# Altium footprint library Chip_Packaging.PcbLib: 101 footprints (part 5 of 7)
Each footprint in its own frame and in the unit in brackets; x right, y up, seen from the top. Pads: shape width x height; smd on the part's side, far side on the other; paste and mask are expansions set on the pad; w line width, h text height; cw(c..) or ccw(c..) is an arc to the next point about the centre after c.
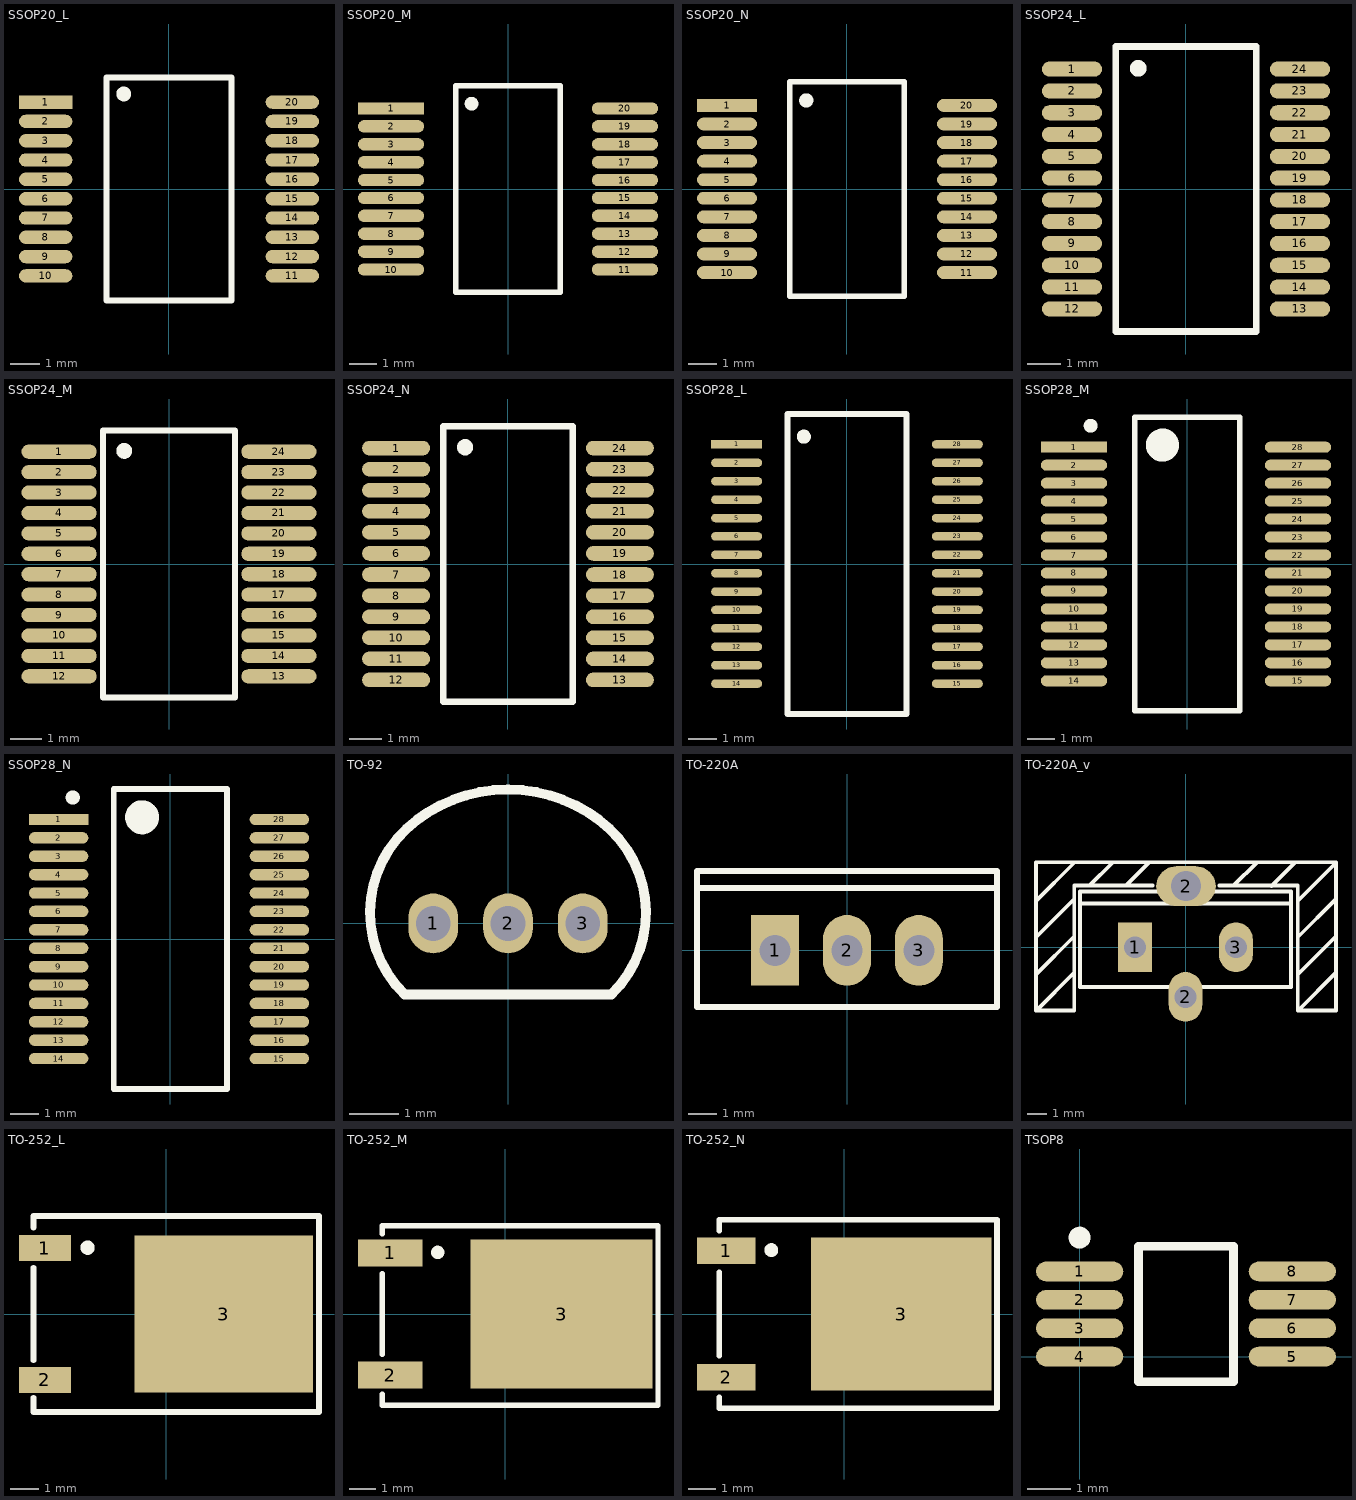
[diagram p4: the footprints below, top view; thin cyan lines are the x and y axes]

## SSOP20_L [mm] "SOP, 20-Leads, Body 7.2x5.3mm, Pitch 0.65mm, IPC High Density"
height 1.99
pads (20):
  rect 1.8x0.45 smd: 1(-4.15,2.925)
  oval 1.8x0.45 smd: 2(-4.15,2.275) 3(-4.15,1.625) 4(-4.15,0.975) 5(-4.15,0.325) 6(-4.15,-0.325) 7(-4.15,-0.975) 8(-4.15,-1.625) 9(-4.15,-2.275) 10(-4.15,-2.925) 11(4.15,-2.925) 12(4.15,-2.275) 13(4.15,-1.625) 14(4.15,-0.975) 15(4.15,-0.325) 16(4.15,0.325) 17(4.15,0.975) 18(4.15,1.625) 19(4.15,2.275) 20(4.15,2.925)
Top Overlay:
  circle w0.25: c-1.525,3.2 r0.125
  lines w0.2: -2.1,-3.75 -2.1,3.75 2.1,3.75 2.1,-3.75 -2.1,-3.75
3D body "SSOP20.STEP": height 1.79, standoff -0.05, extent -3.95,-3.65 3.95,3.65

## SSOP20_M [mm] "SOP, 20-Leads, Body 7.2x5.3mm, Pitch 0.65mm, IPC Low Density"
height 1.99
pads (20):
  rect 2.4x0.45 smd: 1(-4.25,2.925)
  oval 2.4x0.45 smd: 2(-4.25,2.275) 3(-4.25,1.625) 4(-4.25,0.975) 5(-4.25,0.325) 6(-4.25,-0.325) 7(-4.25,-0.975) 8(-4.25,-1.625) 9(-4.25,-2.275) 10(-4.25,-2.925) 11(4.25,-2.925) 12(4.25,-2.275) 13(4.25,-1.625) 14(4.25,-0.975) 15(4.25,-0.325) 16(4.25,0.325) 17(4.25,0.975) 18(4.25,1.625) 19(4.25,2.275) 20(4.25,2.925)
Top Overlay:
  circle w0.25: c-1.325,3.1 r0.125
  lines w0.2: -1.9,-3.75 1.9,-3.75 1.9,3.75 -1.9,3.75 -1.9,-3.75
3D body "SSOP20.STEP": height 1.79, standoff -0.05, extent -3.95,-3.65 3.95,3.65

## SSOP20_N [mm] "SOP, 20-Leads, Body 7.2x5.3mm, Pitch 0.65mm, IPC Medium Density"
height 1.99
pads (20):
  rect 2.1x0.45 smd: 1(-4.2,2.925)
  oval 2.1x0.45 smd: 2(-4.2,2.275) 3(-4.2,1.625) 4(-4.2,0.975) 5(-4.2,0.325) 6(-4.2,-0.325) 7(-4.2,-0.975) 8(-4.2,-1.625) 9(-4.2,-2.275) 10(-4.2,-2.925) 11(4.2,-2.925) 12(4.2,-2.275) 13(4.2,-1.625) 14(4.2,-0.975) 15(4.2,-0.325) 16(4.2,0.325) 17(4.2,0.975) 18(4.2,1.625) 19(4.2,2.275) 20(4.2,2.925)
Top Overlay:
  circle w0.25: c-1.425,3.1 r0.125
  lines w0.2: -2,-3.75 2,-3.75 2,3.75 -2,3.75 -2,-3.75
3D body "SSOP20.STEP": height 1.79, standoff -0.05, extent -3.95,-3.65 3.95,3.65

## SSOP24_L [mm] "SOP, 24-Leads, Body 8.2x5.3mm, Pitch 0.65mm, IPC High Density"
height 1.99
pads (24):
  oval 1.8x0.45 smd: 1(-3.4,3.575) 2(-3.4,2.925) 3(-3.4,2.275) 4(-3.4,1.625) 5(-3.4,0.975) 6(-3.4,0.325) 7(-3.4,-0.325) 8(-3.4,-0.975) 9(-3.4,-1.625) 10(-3.4,-2.275) 11(-3.4,-2.925) 12(-3.4,-3.575) 13(3.4,-3.575) 14(3.4,-2.925) 15(3.4,-2.275) 16(3.4,-1.625) 17(3.4,-0.975) 18(3.4,-0.325) 19(3.4,0.325) 20(3.4,0.975) 21(3.4,1.625) 22(3.4,2.275) 23(3.4,2.925) 24(3.4,3.575)
Top Overlay:
  circle w0.25: c-1.425,3.6 r0.125
  lines w0.2: -2.1,-4.25 2.1,-4.25 2.1,4.25 -2.1,4.25 -2.1,-4.25

## SSOP24_M [mm] "SOP, 24-Leads, Body 8.2x5.3mm, Pitch 0.65mm, IPC Low Density"
height 1.99
pads (24):
  oval 2.4x0.45 smd: 1(-3.5,3.575) 2(-3.5,2.925) 3(-3.5,2.275) 4(-3.5,1.625) 5(-3.5,0.975) 6(-3.5,0.325) 7(-3.5,-0.325) 8(-3.5,-0.975) 9(-3.5,-1.625) 10(-3.5,-2.275) 11(-3.5,-2.925) 12(-3.5,-3.575) 13(3.5,-3.575) 14(3.5,-2.925) 15(3.5,-2.275) 16(3.5,-1.625) 17(3.5,-0.975) 18(3.5,-0.325) 19(3.5,0.325) 20(3.5,0.975) 21(3.5,1.625) 22(3.5,2.275) 23(3.5,2.925) 24(3.5,3.575)
Top Overlay:
  circle w0.25: c-1.425,3.6 r0.125
  lines w0.2: -2.1,-4.25 -2.1,4.25 2.1,4.25 2.1,-4.25 -2.1,-4.25

## SSOP24_N [mm] "SOP, 24-Leads, Body 8.2x5.3mm, Pitch 0.65mm, IPC Medium Density"
height 1.99
pads (24):
  oval 2.1x0.45 smd: 1(-3.45,3.575) 2(-3.45,2.925) 3(-3.45,2.275) 4(-3.45,1.625) 5(-3.45,0.975) 6(-3.45,0.325) 7(-3.45,-0.325) 8(-3.45,-0.975) 9(-3.45,-1.625) 10(-3.45,-2.275) 11(-3.45,-2.925) 12(-3.45,-3.575) 13(3.45,-3.575) 14(3.45,-2.925) 15(3.45,-2.275) 16(3.45,-1.625) 17(3.45,-0.975) 18(3.45,-0.325) 19(3.45,0.325) 20(3.45,0.975) 21(3.45,1.625) 22(3.45,2.275) 23(3.45,2.925) 24(3.45,3.575)
Top Overlay:
  circle w0.25: c-1.325,3.6 r0.125
  lines w0.2: -2,-4.25 2,-4.25 2,4.25 -2,4.25 -2,-4.25

## SSOP28_L [mm] "SOP, 28-Leads, Body 10.2x5.3mm, Pitch 0.65mm, IPC High Density"
height 1.99
pads (28):
  rect 1.8x0.3 smd: 1(-3.9,4.225)
  oval 1.8x0.3 smd: 2(-3.9,3.575) 3(-3.9,2.925) 4(-3.9,2.275) 5(-3.9,1.625) 6(-3.9,0.975) 7(-3.9,0.325) 8(-3.9,-0.325) 9(-3.9,-0.975) 10(-3.9,-1.625) 11(-3.9,-2.275) 12(-3.9,-2.925) 13(-3.9,-3.575) 14(-3.9,-4.225) 15(3.9,-4.225) 16(3.9,-3.575) 17(3.9,-2.925) 18(3.9,-2.275) 19(3.9,-1.625) 20(3.9,-0.975) 21(3.9,-0.325) 22(3.9,0.325) 23(3.9,0.975) 24(3.9,1.625) 25(3.9,2.275) 26(3.9,2.925) 27(3.9,3.575) 28(3.9,4.225)
Top Overlay:
  circle w0.25: c-1.525,4.5 r0.125
  lines w0.2: -2.1,-5.3 2.1,-5.3 2.1,5.3 -2.1,5.3 -2.1,-5.3
3D body "SSOP28.STEP": height 1.98, standoff -0.02, extent -3.906,-5.1 3.906,5.1

## SSOP28_M [mm] "SOP, 28-Leads, Body 10.2x5.3mm, Pitch 0.65mm, IPC Low Density"
height 1.99
pads (28):
  rect 2.4x0.4 smd: 1(-4.1,4.225)
  oval 2.4x0.4 smd: 2(-4.1,3.575) 3(-4.1,2.925) 4(-4.1,2.275) 5(-4.1,1.625) 6(-4.1,0.975) 7(-4.1,0.325) 8(-4.1,-0.325) 9(-4.1,-0.975) 10(-4.1,-1.625) 11(-4.1,-2.275) 12(-4.1,-2.925) 13(-4.1,-3.575) 14(-4.1,-4.225) 15(4,-4.225) 16(4,-3.575) 17(4,-2.925) 18(4,-2.275) 19(4,-1.625) 20(4,-0.975) 21(4,-0.325) 22(4,0.325) 23(4,0.975) 24(4,1.625) 25(4,2.275) 26(4,2.925) 27(4,3.575) 28(4,4.225)
Top Overlay:
  circle w0.6: c-0.9,4.3 r0.3
  circle w0.25: c-3.5,5 r0.125
  lines w0.2: -1.9,-5.3 1.9,-5.3 1.9,5.3 -1.9,5.3 -1.9,-5.3
3D body "SSOP28.STEP": height 1.98, standoff -0.02, extent -3.906,-5.1 3.906,5.1

## SSOP28_N [mm] "SOP, 28-Leads, Body 10.2x5.3mm, Pitch 0.65mm, IPC Medium Density"
height 1.99
pads (28):
  rect 2.1x0.4 smd: 1(-3.95,4.225)
  oval 2.1x0.4 smd: 2(-3.95,3.575) 3(-3.95,2.925) 4(-3.95,2.275) 5(-3.95,1.625) 6(-3.95,0.975) 7(-3.95,0.325) 8(-3.95,-0.325) 9(-3.95,-0.975) 10(-3.95,-1.625) 11(-3.95,-2.275) 12(-3.95,-2.925) 13(-3.95,-3.575) 14(-3.95,-4.225) 15(3.85,-4.225) 16(3.85,-3.575) 17(3.85,-2.925) 18(3.85,-2.275) 19(3.85,-1.625) 20(3.85,-0.975) 21(3.85,-0.325) 22(3.85,0.325) 23(3.85,0.975) 24(3.85,1.625) 25(3.85,2.275) 26(3.85,2.925) 27(3.85,3.575) 28(3.85,4.225)
Top Overlay:
  circle w0.6: c-1,4.3 r0.3
  circle w0.25: c-3.45,5 r0.125
  lines w0.2: -2,-5.3 2,-5.3 2,5.3 -2,5.3 -2,-5.3
3D body "SSOP28.STEP": height 1.98, standoff -0.02, extent -3.906,-5.1 3.906,5.1

## TO-92 [mm]
pads (3):
  oval 1x1.2 hole 0.7 paste+0: 1(-1.5,0) 2(0,0) 3(1.5,0)
Top Overlay:
  lines w0.2: -2.075,-1.428 cw(c-0.468,0.218) -2.048,1.889 cw(c-0.011,-0.313) -0.011,2.687 ; -2.069,-1.431 2.069,-1.431 ; 0.011,2.687 cw(c0.011,-0.313) 2.048,1.889 cw(c0.468,0.218) 2.075,-1.428
3D body "TO-92.STEP": height 10, standoff -3, extent -2.613,-1.59 2.613,2.613

## TO-220A [mm] "TO, Thru-Hole, Vertical, Heatsink Mounted; 3 In-Line Leads; Pitch 2.54 mm"
height 19.7
pads (3):
  rect 1.7x2.5 hole 1.1: 1(-2.54,0)
  oval 1.7x2.5 hole 1.1: 2(0,0) 3(2.54,0)
Top Overlay:
  lines w0.2: -5.3,2.2 5.3,2.2 ; -5.3,-2 -5.3,2.8 5.3,2.8 5.3,-2 -5.3,-2
3D body "TO-220-1.STEP": height 22.8, standoff -5.98, extent -4.95,-2 4.95,2.5

## TO-220A_v [mm] "TO, Thru-Hole, Vertical, Heatsink Mounted; 3 In-Line Leads; Pitch 2.54 mm"
height 19.7
pads (4):
  rect 1.7x2.5 hole 1.1: 1(-2.54,0)
  oval 1.7x2.5 hole 1.1: 2(0,-2.5) 3(2.54,0)
  oval 3x2 hole 1.5: 2(0.025,3.075)
Top Overlay:
  lines w0.2: -7.525,0.5 -5.625,2.4 ; -7.525,2.325 -5.625,4.225 ; -7.5,-1.35 -5.6,0.55 ; -5.6,-1.275 -7.5,-3.175 -7.525,-3.175 ; -5.3,2.2 5.3,2.2 ; -4.825,3.1 -3.687,4.237 ; -3,3.1 -1.837,4.263 ; -1.65,3.1 -5.6,3.1 -5.6,-3.175 -7.525,-3.175 ; 1.7,3.1 5.65,3.1 5.65,-3.175 7.575,-3.175 7.575,4.275 -7.525,4.275 -7.525,-3.175 ; 2.425,3.1 3.588,4.263 ; 4.325,3.075 5.488,4.238 ; 5.65,0.5 7.55,2.4 ; 5.65,2.325 7.55,4.225 ; 5.675,-3.175 7.575,-1.275 ; 5.675,-1.35 7.575,0.55 ; -5.3,-2 -5.3,2.8 5.3,2.8 5.3,-2 -5.3,-2
3D body "TO-220_1-centeral_pin_forward_a.STEP": height 23.21, standoff -3.95, extent -5.2,-2.9 5.2,2.841
3D body "HEATSINK_TO-220 (3).STEP": height 26.52, standoff 7.47, extent -7.366,-3.075 7.516,4.111

## TO-252_L [mm] "D-PAK, 4-Leads, Body 6.1x6.5mm, Pitch 2.28mm, Lead Span 9.7mm, IPC High Density"
height 2.4
pads (3):
  rect 1.8x0.9 smd: 1(-4.2,2.28) 2(-4.2,-2.28)
  rect 6.2x5.45 smd: 3(2,0)
Top Overlay:
  circle w0.25: c-2.725,2.3 r0.125
  lines w0.2: -4.6,-2.9 -4.6,-3.4 5.3,-3.4 5.3,3.4 -4.6,3.4 -4.6,3 ; -4.6,-1.6 -4.6,1.6
3D body "TO-252.STEP": height 2.3, standoff 0, extent -4.473,-3.29 5.227,3.29

## TO-252_M [mm] "D-PAK, 4-Leads, Body 6.1x6.5mm, Pitch 2.28mm, Lead Span 9.7mm, IPC Low Density"
height 2.4
pads (3):
  rect 2.4x1 smd: 1(-4.3,2.28) 2(-4.3,-2.28)
  rect 6.8x5.55 smd: 3(2.1,0)
Top Overlay:
  circle w0.25: c-2.525,2.3 r0.125
  lines w0.2: -4.6,-3 -4.6,-3.4 5.7,-3.4 5.7,3.3 -4.6,3.3 -4.6,3 ; -4.6,-1.5 -4.6,1.5
3D body "TO-252.STEP": height 2.3, standoff 0, extent -4.473,-3.29 5.227,3.29

## TO-252_N [mm] "D-PAK, 4-Leads, Body 6.1x6.5mm, Pitch 2.28mm, Lead Span 9.7mm, IPC Medium Density"
height 2.4
pads (3):
  rect 2.1x0.95 smd: 1(-4.25,2.28) 2(-4.25,-2.28)
  rect 6.5x5.5 smd: 3(2.05,0)
Top Overlay:
  circle w0.25: c-2.625,2.3 r0.125
  lines w0.2: -4.5,-3 -4.5,-3.4 5.5,-3.4 5.5,3.4 -4.5,3.4 -4.5,3 ; -4.5,-1.5 -4.5,1.5
3D body "TO-252.STEP": height 2.3, standoff 0, extent -4.473,-3.29 5.227,3.29

## TSOP8 [mm] "TSOP, 8-Leads, Body 3x3mm, Pitch 0.65mm, IPC High Density"
height 1.1
pads (8):
  oval 2x0.45 smd: 1(0,1.95) 2(0,1.3) 3(0,0.65) 4(0,0) 5(4.875,0) 6(4.875,0.65) 7(4.875,1.3) 8(4.875,1.95)
Top Overlay:
  circle w0.25: c0,2.725 r0.125
  lines w0.2: 1.35,-0.575 3.525,-0.575 3.525,2.525 1.35,2.525 1.35,-0.575
3D body "TSOP8.STEP": height 1.2, standoff 0, extent -0.75,-0.55 5.65,2.55